# Altium schematic symbol library Schlib.SchLib: 725 symbols (part 2 of 6) (continued)
## CSS2H-2512R-1L00FE (continued)
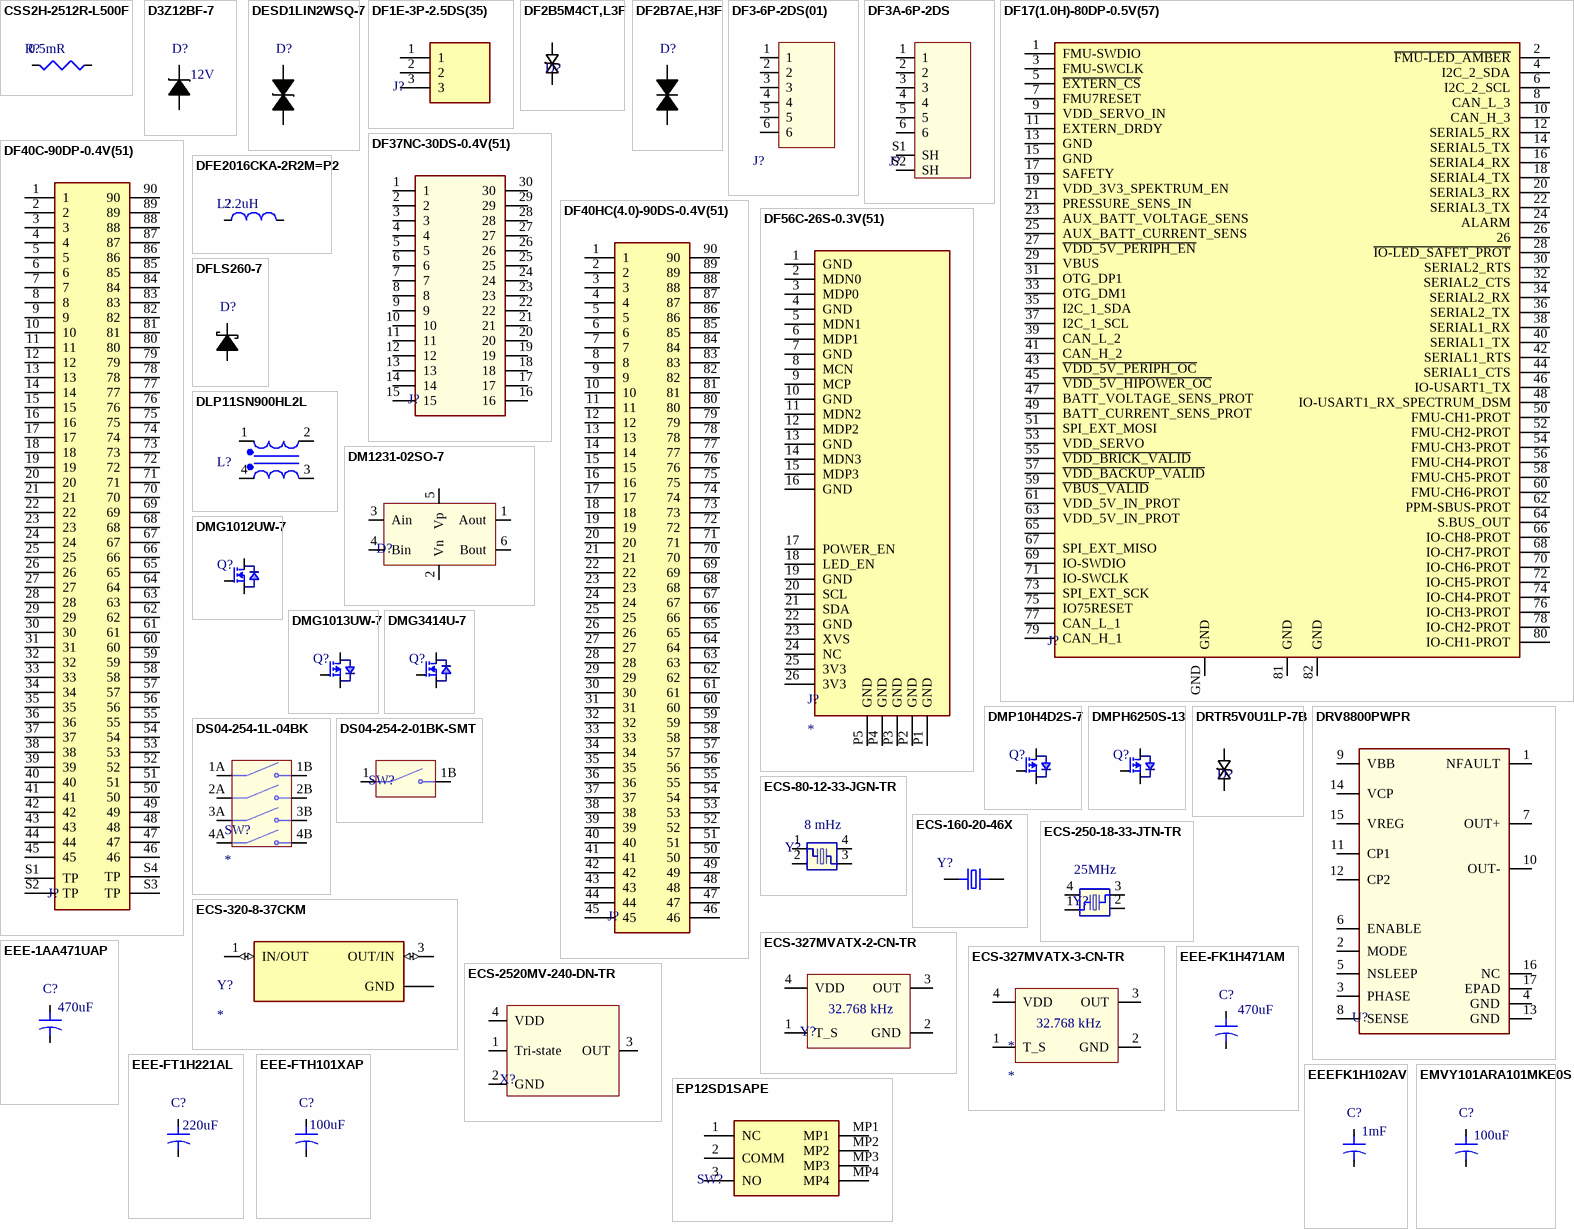
[diagram p7: symbols CSS2H-2512R-L500F to EP12SD1SAPE]

## CSS2H-2512R-L500F
designator R?  value 0.5mR  (hidden comment: *)
Res Current Sense Metal Strip 2512 0.00005 Ohm 1% 6W ±100ppm/°C T/R; Manufacturer: Bourns; Manufacturer Part Number: CSS2H-2512R-L500F; Temperature Coefficient: 50ppm/°C; Supplier: Avnet; Supplier Part Number: 34AK1558; RoHS: Yes; Category: Chip SMD Resistors; Stock: 5588; Pricing: 1=1.43, 25=1.16, 50=1.06, 100=0.918, 250=0.775 (USD); Case/Package: 2512; Case Code (Metric): 6432; Case Code (Imperial): 2512; Min Operating Temperature: -55°C; Max Operating Temperature: 170°C; Packaging: Cut Tape; Number of Terminations: 2; Tolerance: 1%; Max Power Dissipation: 6W; Features: Moisture Resistant; Series: CSS2H-2512; Power Rating: 6W; Resistor Type: Metal Strip; Resistance Tolerance: 1%; Length: 0.25inch; Width: 0.12inch; Height: 0.037inch; RoHS Compliant: Yes; Reach SVHC Compliant: No; ComponentLink1URL: http://www.farnell.com/datasheets/2058210.pdf?src-supplier=Farnell; ComponentLink1Description: http://www.farnell.com/datasheets/2058210.pdf?src-supplier=Farnell; ComponentLink2URL: https://datasheet.octopart.com/CSS2H-2512R-L500F-Bourns-datasheet-62345526.pdf?src-supplier=Newark; ComponentLink2Description: https://datasheet.octopart.com/CSS2H-2512R-L500F-Bourns-datasheet-62345526.pdf?src-supplier=Newark; ComponentLink3URL: http://www.farnell.com/datasheets/2058210.pdf?src-supplier=Element14; ComponentLink3Description: http://www.farnell.com/datasheets/2058210.pdf?src-supplier=Element14; ComponentLink4URL: http://www.farnell.com/datasheets/2058210.pdf?src-supplier=Newark; ComponentLink4Description: http://www.farnell.com/datasheets/2058210.pdf?src-supplier=Newark; ComponentLink5URL: https://www.bourns.com/docs/Product-Datasheets/css2h-2512.pdf?src-supplier=Digi-Key; ComponentLink5Description: https://www.bourns.com/docs/Product-Datasheets/css2h-2512.pdf?src-supplier=Digi-Key; ComponentLink6URL: https://datasheet.octopart.com/CSS2H-2512R-L500F-Bourns-datasheet-137010645.pdf?src-supplier=Electro+Sonic; ComponentLink6Description: https://datasheet.octopart.com/CSS2H-2512R-L500F-Bourns-datasheet-137010645.pdf?src-supplier=Electro+Sonic
footprint R 2512 6W Current sens
pins: 1 B, 2 A

## D3Z12BF-7
designator D?  Voltage - Zener: 12V  (hidden comment: *)
Zener Diode Single 11.99V 2.09% 10Ohm 400mW 2-Pin SOD-323F T/R; Manufacturer: Diodes; Manufacturer Part Number: D3Z12BF-7; Tolerance: 2%; Impedance: 10R; Max Reverse Leakage Current: 100nA; Forward Voltage: 900mV; ESD Protection: No; Test Current: 5mA; Supplier: Future Electronics; Supplier Part Number: 4153081; RoHS: Yes; Category: Zener Diodes; Stock: 27000; Pricing: 3000=0.0252, 9000=0.0243, 15000=0.0239, 60000=0.0228, 90000=0.0221 (USD); Mounting Technology: Surface Mount; Pins: 2; Contact Plating: Tin,Matte; Min Operating Temperature: -65°C; Max Operating Temperature: 150°C; Packaging: Tape and Reel; Package Quantity: 3000; Max Power Dissipation: 400mW; Zener Voltage: 12V; Voltage Tolerance: 2.09%; Termination: SMD/SMT; Zener Current: 100nA; Max Reverse Current: 100nA; Power Rating: 400mW; Series: -; Diode Type: ZENER; Length: 2.5mm; Width: 1.25mm; Height: 0.75mm; Reach SVHC Compliant: Yes; Lead Free: Lead Free; RoHS Compliant: Yes; ComponentLink1URL: http://components.arrow.com/part/dataview/51721222S9314677N2867?src-supplier=Arrow+Electronics; ComponentLink1Description: http://components.arrow.com/part/dataview/51721222S9314677N2867?src-supplier=Arrow+Electronics; ComponentLink2URL: http://www.mouser.com/ds/2/115/D3ZxVxBF-259596.pdf?src-supplier=Mouser; ComponentLink2Description: http://www.mouser.com/ds/2/115/D3ZxVxBF-259596.pdf?src-supplier=Mouser; ComponentLink3URL: https://www.diodes.com/assets/Datasheets/D3ZxVxBF.pdf?src-supplier=Digikey; ComponentLink3Description: https://www.diodes.com/assets/Datasheets/D3ZxVxBF.pdf?src-supplier=Digikey; ComponentLink4URL: http://www.diodes.com/datasheets/D3ZxVxBF.pdf?src-supplier=Avnet; ComponentLink4Description: http://www.diodes.com/datasheets/D3ZxVxBF.pdf?src-supplier=Avnet; ComponentLink5URL: https://datasheet.octopart.com/D3Z12BF-7-Diodes-Inc.-datasheet-101745804.pdf?src-supplier=Newark; ComponentLink5Description: https://datasheet.octopart.com/D3Z12BF-7-Diodes-Inc.-datasheet-101745804.pdf?src-supplier=Newark
footprint SC-90, SOD-323F
pins: 1 C, 2 A

## DESD1LIN2WSQ-7
designator D?  (value not drawn)
DESD1LIN2WSQ Series 24 V 3 A 160 mW SMT Bi-Directional TVS Diode - SOD-323; Manufacturer: Diodes; Manufacturer Part Number: DESD1LIN2WSQ-7; Number of Bidirectional Channels: 1; Reverse Standoff Voltage: 24V; Min Breakdown Voltage: 25.4V; Clamping Voltage: 50V; Peak Pulse Power: 160W; Power Line Protection: No; Peak Pulse Current: 3A; Supplier: Digi-Key; Supplier Part Number: DESD1LIN2WSQ-7DICT-ND; RoHS: Yes; Category: TVS Diodes; Stock: 23012; Pricing: 1=0.46000, 10=0.34600, 100=0.21530, 500=0.14728, 1000=0.11330 (USD); Mounting Technology: Surface Mount; Min Operating Temperature: -65°C; Max Operating Temperature: 150°C; Packaging: Tape and Reel; Resistor Type: Zener; RoHS Compliant: Yes; ComponentLink1URL: http://www.mouser.com/ds/2/115/DESD1LIN2WSQ-520303.pdf?src-supplier=Mouser; ComponentLink1Description: http://www.mouser.com/ds/2/115/DESD1LIN2WSQ-520303.pdf?src-supplier=Mouser; ComponentLink2URL: https://www.diodes.com/assets/Datasheets/DESD1LIN2WSQ.pdf?src-supplier=Digi-Key; ComponentLink2Description: https://www.diodes.com/assets/Datasheets/DESD1LIN2WSQ.pdf?src-supplier=Digi-Key
footprint SC-76, SOD-323
pins: 1, 2

## DF1E-3P-2.5DS(35)
designator J?  (value not drawn)
[SignalBee™]2.5mm Pitch Connector for Full Lock, Discrete Wire Connection, -35 ℃ to 85 ℃, RoHS; Manufacturer: HIROSE ELECTRIC; Manufacturer Part Number: DF1E-3P-2.5DS(35); Connector Type: Plug; Contact Pitch: 2.5mm; Contact Resistance: 30mΩ; Contact Voltage Rating (AC): 250V; Current Rating: 3A; Dielectric Material: Polyamide; Insulation Resistance: 1GΩ; Number of Positions: 3; Supplier: DigiKey; Supplier Part Number: H125157-ND; RoHS: Compliant; Category: Card Edge Connectors; Stock: 1876; Pricing: 1=0.56, 10=0.475, 100=0.4032, 500=0.35986, 1000=0.34267, 5000=0.30588, 10000=0.29129 (USD); Contact Gender: Male; Contact Material: Brass; Contact Mating Length: 4.4958mm; Contact Plating: Tin; Fastening Type: Latch; Height: 8mm; Length: 10mm; Lifecycle Status: Production; Max Operating Temperature: 85°C; Min Operating Temperature: -35°C; Mounting Technology: Through Hole; Pins: 3; Number of Rows: 1; Orientation: Right Angle; Pitch: 2.5mm; REACH SVHC: Yes; Terminal Pitch: 2.4892mm; Termination: Solder; Width: 13.8mm; ComponentLink1URL: https://datasheet.octopart.com:443/DF1E-3P-2.5DS%2835%29-HIROSE-ELECTRIC-datasheet-180000536.pdf?src-supplier=IHS; ComponentLink1Description: https://datasheet.octopart.com:443/DF1E-3P-2.5DS%2835%29-HIROSE-ELECTRIC-datasheet-180000536.pdf?src-supplier=IHS; ComponentLink2URL: https://datasheet.octopart.com:443/DF1E-3P-2.5DS%2835%29-HIROSE-ELECTRIC-datasheet-181927310.pdf?src-supplier=Electro+Sonic; ComponentLink2Description: https://datasheet.octopart.com:443/DF1E-3P-2.5DS%2835%29-HIROSE-ELECTRIC-datasheet-181927310.pdf?src-supplier=Electro+Sonic; ComponentLink3URL: https://datasheet.octopart.com:443/DF1E-3P-2.5DS%2835%29-HIROSE-ELECTRIC-datasheet-188748073.pdf?src-supplier=Master+Electronics; ComponentLink3Description: https://datasheet.octopart.com:443/DF1E-3P-2.5DS%2835%29-HIROSE-ELECTRIC-datasheet-188748073.pdf?src-supplier=Master+Electronics; ComponentLink4URL: https://datasheet.octopart.com:443/DF1E-3P-2.5DS%2835%29-Hirose-datasheet-168215267.pdf?src-supplier=TME; ComponentLink4Description: https://datasheet.octopart.com:443/DF1E-3P-2.5DS%2835%29-Hirose-datasheet-168215267.pdf?src-supplier=TME; ComponentLink5URL: https://datasheet.octopart.com:443/DF1E-3P-2.5DS%2835%29-Hirose-datasheet-163673710.pdf?src-supplier=Future+Electronics; ComponentLink5Description: https://datasheet.octopart.com:443/DF1E-3P-2.5DS%2835%29-Hirose-datasheet-163673710.pdf?src-supplier=Future+Electronics; ComponentLink6URL: https://datasheet.octopart.com:443/DF1E-3P-2.5DS%2835%29-Hirose-datasheet-154565669.pdf?src-supplier=Sager+Electronics; ComponentLink6Description: https://datasheet.octopart.com:443/DF1E-3P-2.5DS%2835%29-Hirose-datasheet-154565669.pdf?src-supplier=Sager+Electronics; ComponentLink7URL: https://datasheet.octopart.com:443/DF1E-3P-2.5DS%2835%29-Hirose-datasheet-140476234.pdf?src-supplier=Sager+Electronics; ComponentLink7Description: https://datasheet.octopart.com:443/DF1E-3P-2.5DS%2835%29-Hirose-datasheet-140476234.pdf?src-supplier=Sager+Electronics; ComponentLink8URL: https://datasheet.octopart.com:443/DF1E-3P-2.5DS%2835%29-Hirose-datasheet-62290548.pdf?src-supplier=Sager+Electronics; ComponentLink8Description: https://datasheet.octopart.com:443/DF1E-3P-2.5DS%2835%29-Hirose-datasheet-62290548.pdf?src-supplier=Sager+Electronics; ComponentLink9URL: https://sigma.octopart.com:443/145363035/technical_drawing/Hirose-DF1E-3P-2.5DS%2835%29.pdf?src-supplier=Hirose+SCT; ComponentLink9Description: https://sigma.octopart.com:443/145363035/technical_drawing/Hirose-DF1E-3P-2.5DS%2835%29.pdf?src-supplier=Hirose+SCT; ComponentLink10URL: https://datasheet.octopart.com:443/DF1E-3P-2.5DS%2835%29-Hirose-datasheet-145363033.pdf?src-supplier=Hirose+SCT; ComponentLink10Description: https://datasheet.octopart.com:443/DF1E-3P-2.5DS%2835%29-Hirose-datasheet-145363033.pdf?src-supplier=Hirose+SCT
footprint DF1E-3P-2.5DS(35)
pins: 1, 2, 3

## DF2B5M4CT,L3F
designator D?  (value not drawn)
ESD Suppressors / TVS Diodes ESD protection diode .3pF 5.0V; Manufacturer: Toshiba; Manufacturer Part Number: DF2B5M4CT,L3F; Supplier: Digikey; Supplier Part Number: DF2B5M4CTL3FCT-ND; RoHS: No; Category: TVS Diodes; Stock: 816; Pricing: 1=0.17, 10=0.113, 100=0.0758, 500=0.0578, 1000=0.05172, 2000=0.0465, 5000=0.04072 (USD); ComponentLink1URL: https://toshiba.semicon-storage.com/info/docget.jsp?did=55770&prodName=DF2B5M4CT&src-supplier=Digikey; ComponentLink1Description: https://toshiba.semicon-storage.com/info/docget.jsp?did=55770&prodName=DF2B5M4CT&src-supplier=Digikey
footprint DF2B5M4CT,L3F
pins: 1, 2

## DF2B7AE,H3F
designator D?  (value not drawn)
ESD Suppressor Diode TVS Bi-Dir 5.5V 2-Pin ESC T/R; Manufacturer: Toshiba; Manufacturer Part Number: DF2B7AE,H3F; Supplier: Mouser; Supplier Part Number: 757-DF2B7AEH3F; RoHS: No; Category: TVS Diodes; Stock: 111094; Pricing: 1=0.21, 10=0.146, 50=0.146, 100=0.059, 1000=0.036, 10000=0.027 (USD)
footprint SC-79, SOD-523
pins: 1, 2

## DF3-6P-2DS(01)
designator J?  (value not drawn)
Board-to-Cable Connector (Terminal 1 Row Type) with 2-mm Pitch - DF3 Series (HIROSE ELECTRIC); Manufacturer Part Number: DF3-6P-2DS(01); Supplier: Rs; Supplier Part Number: 7794954P; Manufacturer: Hirose; RoHS: Yes; Category: Headers and Wire Housings; Stock: 65; Pricing: 25=6.502, 50=6.362 (HKD); ComponentLink1URL: https://datasheet.ciiva.com/30492/0900766b8122dd93-30492925.pdf?src-supplier=Rs; ComponentLink1Description: https://datasheet.ciiva.com/30492/0900766b8122dd93-30492925.pdf?src-supplier=Rs; ComponentLink2URL: https://datasheet.ciiva.com/26938/getdatasheetpartid-434437-26938796.pdf?src-supplier=Verical; ComponentLink2Description: https://datasheet.ciiva.com/26938/getdatasheetpartid-434437-26938796.pdf?src-supplier=Verical; ComponentLink3URL: https://datasheet.ciiva.com/5151/e54300012-5151166.pdf?src-supplier=Mouser; ComponentLink3Description: https://datasheet.ciiva.com/5151/e54300012-5151166.pdf?src-supplier=Mouser; ComponentLink4URL: https://datasheet.ciiva.com/711/e54300012-711200.pdf?src-supplier=Digikey; ComponentLink4Description: https://datasheet.ciiva.com/711/e54300012-711200.pdf?src-supplier=Digikey; ComponentLink5URL: https://datasheet.ciiva.com/9481/e54300012-9481366.pdf?src-supplier=Avnet; ComponentLink5Description: https://datasheet.ciiva.com/9481/e54300012-9481366.pdf?src-supplier=Avnet
footprint DF3-6P-2DS(01) (Footprint not found)
pins: 1, 2, 3, 4, 5, 6

## DF3A-6P-2DS
designator J?  (value not drawn)
Board-to-Cable Connector (Terminal 1 Row Type) with 2-mm Pitch - DF3 Series (HIROSE ELECTRIC); Manufacturer Part Number: DF3A-6P-2DS; Current Rating: 3A; Voltage Rating: 250V; Number of Positions: 6; Gender: Male; Insulation Resistance: 1GR; Connector Type: Header; Pitch: 2mm; Supplier: Newark; Supplier Part Number: 24R6036; Manufacturer: Hirose; RoHS: Yes; Category: Headers and Wire Housings; Mounting Technology: Through Hole; Contact Plating: Tin; Contact Material: Brass,Copper Alloy; Insulation Material: Nylon; Housing Color: Black; Housing Material: Polyamide; Contact Shape: Square; Contact Finish - Mating: TIN; Insulation Color: Black; Min Operating Temperature: -55°C; Max Operating Temperature: 105°C; Package Quantity: 100; Packaging: Bulk; Number of Rows: 1; Contact Gender: Male; Termination: Through Hole; Series: DF3; Contact Type: Male Pin; Number of Contacts: 6; Orientation: Right Angle; Fastening Type: Pull; Length: 14mm; Height: 5mm; RoHS Compliant: Yes; Reach SVHC Compliant: No; Lead Free: Lead Free; Flammability Rating: UL94 V-0; ComponentLink1URL: https://datasheet.ciiva.com/11752/0900766b808069aa-11752280.pdf?src-supplier=Rs; ComponentLink1Description: https://datasheet.ciiva.com/11752/0900766b808069aa-11752280.pdf?src-supplier=Rs; ComponentLink2URL: https://datasheet.ciiva.com/711/e54300012-711081.pdf?src-supplier=Digikey; ComponentLink2Description: https://datasheet.ciiva.com/711/e54300012-711081.pdf?src-supplier=Digikey; ComponentLink3URL: https://datasheet.ciiva.com/16211/e54300012-16211577.pdf?src-supplier=Future+Electronics; ComponentLink3Description: https://datasheet.ciiva.com/16211/e54300012-16211577.pdf?src-supplier=Future+Electronics
footprint DF3A-6P-2DS
pins: 1, 2, 3, 4, 5, 6, S1 SH, S2 SH

## DF17(1.0H)-80DP-0.5V(57)
designator J?  (value not drawn)
Board-to-Board Connector with 0.5-mm Pitch, 4 to 8-mm Height - DF17 Series; Manufacturer: Hirose; Manufacturer Part Number: DF17(1.0H)-80DP-0.5V(57); Number of Positions: 80; Gender: Male; Mated Stacking Heights: 4mm; Row Spacing: 5.7mm; Supplier: Mouser; Supplier Part Number: 798-DF1710H80DP05V57; RoHS: Yes; Category: Headers and Wire Housings; Stock: 19920; Pricing: 1=2.86, 10=2.37, 50=2.37, 100=2.22, 1000=1.6, 10000=1.6 (USD); Mounting Technology: Surface Mount; Contact Plating: Gold; Contact Material: Bronze; Number of Rows: 2; Packaging: Tape and Reel; Package Quantity: 1000; Series: DF17; Number of Contacts: 80; Termination: SMD/SMT; Lead Free: Lead Free; RoHS Compliant: Yes; Reach SVHC Compliant: No; ComponentLink1URL: https://datasheet.ciiva.com/8038/1726048-8038857.pdf?src-supplier=Element14; ComponentLink1Description: https://datasheet.ciiva.com/8038/1726048-8038857.pdf?src-supplier=Element14
footprint DF17(1.0H)-80DP-0.5V(57)
pins: 1 FMU-SWDIO, 2 ~{FMU-LED_AMBER}, 3 FMU-SWCLK, 4 I2C_2_SDA, 5 ~{EXTERN_CS}, 6 I2C_2_SCL, 7 FMU7RESET, 8 CAN_L_3, 9 VDD_SERVO_IN, 10 CAN_H_3, 11 EXTERN_DRDY, 12 SERIAL5_RX, 13 GND, 14 SERIAL5_TX, 15 GND, 16 SERIAL4_RX, 17 SAFETY, 18 SERIAL4_TX, 19 VDD_3V3_SPEKTRUM_EN, 20 SERIAL3_RX, 21 PRESSURE_SENS_IN, 22 SERIAL3_TX, 23 AUX_BATT_VOLTAGE_SENS, 24 ALARM, 25 AUX_BATT_CURRENT_SENS, 26, 27 ~{VDD_5V_PERIPH_EN}, 28 ~{IO-LED_SAFET_PROT}, 29 VBUS, 30 SERIAL2_RTS, 31 OTG_DP1, 32 SERIAL2_CTS, 33 OTG_DM1, 34 SERIAL2_RX, 35 I2C_1_SDA, 36 SERIAL2_TX, 37 I2C_1_SCL, 38 SERIAL1_RX, 39 CAN_L_2, 40 SERIAL1_TX, 41 CAN_H_2, 42 SERIAL1_RTS, 43 ~{VDD_5V_PERIPH_OC}, 44 SERIAL1_CTS, 45 ~{VDD_5V_HIPOWER_OC}, 46 IO-USART1_TX, 47 BATT_VOLTAGE_SENS_PROT, 48 IO-USART1_RX_SPECTRUM_DSM, 49 BATT_CURRENT_SENS_PROT, 50 FMU-CH1-PROT, 51 SPI_EXT_MOSI, 52 FMU-CH2-PROT, 53 VDD_SERVO, 54 FMU-CH3-PROT, 55 ~{VDD_BRICK_VALID}, 56 FMU-CH4-PROT, 57 ~{VDD_BACKUP_VALID}, 58 FMU-CH5-PROT, 59 ~{VBUS_VALID}, 60 FMU-CH6-PROT, 61 VDD_5V_IN_PROT, 62 PPM-SBUS-PROT, 63 VDD_5V_IN_PROT, 64 S.BUS_OUT, 65, 66 IO-CH8-PROT, 67 SPI_EXT_MISO, 68 IO-CH7-PROT, 69 IO-SWDIO, 70 IO-CH6-PROT, 71 IO-SWCLK, 72 IO-CH5-PROT, 73 SPI_EXT_SCK, 74 IO-CH4-PROT, 75 IO75RESET, 76 IO-CH3-PROT, 77 CAN_L_1, 78 IO-CH2-PROT, 79 CAN_H_1, 80 IO-CH1-PROT, 81 GND, 82 GND, GND

## DF37NC-30DS-0.4V(51)
designator J?  (value not drawn)
Conn Stacking RCP 30 POS 0.98mm Stack Height 0.4mm Solder ST SMD Emboss T/R; Manufacturer: Hirose; Manufacturer Part Number: DF37NC-30DS-0.4V(51); Supplier: Digi-Key; Supplier Part Number: H11856CT-ND; RoHS: Yes; Category: Connectors; ComponentLink1URL: http://www.mouser.com/ds/2/185/DF37_catalog-939311.pdf?src-supplier=Mouser; ComponentLink1Description: http://www.mouser.com/ds/2/185/DF37_catalog-939311.pdf?src-supplier=Mouser; ComponentLink2URL: https://www.hirose.com/product/document?clcode=CL0684-3008-1-53&amp;productname=DF37B-20DP-0.4V(53)&amp;series=DF37&amp;documenttype=Catalog&amp;lang=en&amp;documentid=D49052_en&src-supplier=Digi-Key; ComponentLink2Description: https://www.hirose.com/product/document?clcode=CL0684-3008-1-53&amp;productname=DF37B-20DP-0.4V(53)&amp;series=DF37&amp;documenttype=Catalog&amp;lang=en&amp;documentid=D49052_en&src-supplier=Digi-Key; ComponentLink3URL: https://www.hirose.com/product/en/download_file/key_name/DF37NC-30DS-0.4V%2851%29/category/Specification%20Sheet/doc_file_id/46745/?file_category_id=9&item_id=06843313551&is_series=&src-supplier=Digi-Key; ComponentLink3Description: https://www.hirose.com/product/en/download_file/key_name/DF37NC-30DS-0.4V%2851%29/category/Specification%20Sheet/doc_file_id/46745/?file_category_id=9&item_id=06843313551&is_series=&src-supplier=Digi-Key
footprint DF37NC-30DS-0.4V(51)
pins: 1, 2, 3, 4, 5, 6, 7, 8, 9, 10, 11, 12, 13, 14, 15, 16, 17, 18, 19, 20, 21, 22, 23, 24, 25, 26, 27, 28, 29, 30

## DF40C-90DP-0.4V(51)
designator J?  (value not drawn)
Board-to-Board Connector with 0.4-mm Pitch, 1.5 - 4.0-mm Height - DF40 Series (HIROSE ELECTRIC); Manufacturer Part Number: DF40C-90DP-0.4V(51); Current Rating: 300mA; Voltage Rating: 30V; Number of Positions: 90; Connector Type: Plug; Pitch: 0.4mm; Mated Stacking Heights: 4mm; Supplier: Digikey; Supplier Part Number: H11878CT-ND; Manufacturer: Hirose; RoHS: Yes; Category: Board to Board Connectors; Stock: 25231; Pricing: 1=1.87, 10=1.525, 25=1.4056, 50=1.3216, 100=1.2428, 250=1.14576, 500=1.07746, 1000=1.01326, 2500=0.9375 (USD); Mounting Technology: Surface Mount; Contact Material: Bronze; Contact Plating: Gold; Housing Material: Polymer; Package Quantity: 5000; Number of Rows: 2; Packaging: Tape and Reel; Termination: SMD/SMT; Series: DF40; Lead Free: Lead Free; RoHS Compliant: Yes; ComponentLink1URL: http://www.mouser.com/ds/2/185/DF40_catalog-939157.pdf?src-supplier=Mouser; ComponentLink1Description: http://www.mouser.com/ds/2/185/DF40_catalog-939157.pdf?src-supplier=Mouser; ComponentLink2URL: https://www.hirose.com/product/document?clcode=CL0684-4003-3-51&amp;productname=DF40C-60DP-0.4V(51)&amp;series=DF40&amp;documenttype=Catalog&amp;lang=en&amp;documentid=D31649_en&src-supplier=Digikey; ComponentLink2Description: https://www.hirose.com/product/document?clcode=CL0684-4003-3-51&amp;productname=DF40C-60DP-0.4V(51)&amp;series=DF40&amp;documenttype=Catalog&amp;lang=en&amp;documentid=D31649_en&src-supplier=Digikey; ComponentLink3URL: https://www.hirose.com/product/en/download_file/key_name/DF40C-90DP-0.4V%2851%29/category/Specification%20Sheet/doc_file_id/46853/?file_category_id=9&item_id=06844125051&is_series=&src-supplier=Digikey; ComponentLink3Description: https://www.hirose.com/product/en/download_file/key_name/DF40C-90DP-0.4V%2851%29/category/Specification%20Sheet/doc_file_id/46853/?file_category_id=9&item_id=06844125051&is_series=&src-supplier=Digikey; ComponentLink4URL: https://datasheet.octopart.com/DF40C-90DP-0.4V%2851%29-Hirose-datasheet-130255728.pdf?src-supplier=Future+Electronics; ComponentLink4Description: https://datasheet.octopart.com/DF40C-90DP-0.4V%2851%29-Hirose-datasheet-130255728.pdf?src-supplier=Future+Electronics; ComponentLink5URL: https://datasheet.octopart.com/DF40C-90DP-0.4V%2851%29-Hirose-datasheet-138123797.pdf?src-supplier=LKR; ComponentLink5Description: https://datasheet.octopart.com/DF40C-90DP-0.4V%2851%29-Hirose-datasheet-138123797.pdf?src-supplier=LKR
footprint DF40C-90DP-0.4V(51)
pins: 1, 2, 3, 4, 5, 6, 7, 8, 9, 10, 11, 12, 13, 14, 15, 16, 17, 18, 19, 20, 21, 22, 23, 24, 25, 26, 27, 28, 29, 30, 31, 32, 33, 34, 35, 36, 37, 38, 39, 40, 41, 42, 43, 44, 45, 46, 47, 48, 49, 50, 51, 52, 53, 54, 55, 56, 57, 58, 59, 60, 61, 62, 63, 64, 65, 66, 67, 68, 69, 70, 71, 72, 73, 74, 75, 76, 77, 78, 79, 80, 81, 82, 83, 84, 85, 86, 87, 88, 89, 90, S1 TP, S2 TP, S3 TP, S4 TP

## DF40HC(4.0)-90DS-0.4V(51)
designator J?  (value not drawn)
90 Position Connector Receptacle, Center Strip Contacts Surface Mount Gold; Manufacturer: Hirose; Manufacturer Part Number: DF40HC(4.0)-90DS-0.4V(51); Voltage Rating: 30V; Current Rating: 300mA; Number of Positions: 90; Pitch: 0.4mm; Stack Height: 4mm; Supplier: Digikey; Supplier Part Number: H11998CT-ND; RoHS: Yes; Category: Board to Board Connectors; Stock: 6447; Pricing: 1=2.55, 10=2.074, 25=1.9116, 50=1.7976, 100=1.6904, 250=1.55848, 500=1.46562, 1000=1.37831 (USD); Mounting Technology: Surface Mount; Contact Plating: Gold; Contact Material: Bronze; Housing Material: Polymer; Package Quantity: 2000; Number of Rows: 2; Packaging: Tape and Reel; Connector Type: Receptacle; Termination: SMD/SMT; Gender: Receptacle; Number of Contacts: 90; Series: DF40; Mated Stacking Heights: 4mm; Reach SVHC Compliant: No; RoHS Compliant: Yes; ComponentLink1URL: https://datasheet.ciiva.com/46408/1824826-46408922.pdf?src-supplier=Element14; ComponentLink1Description: https://datasheet.ciiva.com/46408/1824826-46408922.pdf?src-supplier=Element14
footprint DF40HC4090DS04V51
pins: 1, 2, 3, 4, 5, 6, 7, 8, 9, 10, 11, 12, 13, 14, 15, 16, 17, 18, 19, 20, 21, 22, 23, 24, 25, 26, 27, 28, 29, 30, 31, 32, 33, 34, 35, 36, 37, 38, 39, 40, 41, 42, 43, 44, 45, 46, 47, 48, 49, 50, 51, 52, 53, 54, 55, 56, 57, 58, 59, 60, 61, 62, 63, 64, 65, 66, 67, 68, 69, 70, 71, 72, 73, 74, 75, 76, 77, 78, 79, 80, 81, 82, 83, 84, 85, 86, 87, 88, 89, 90

## DF56C-26S-0.3V(51)
designator J?
0.3mm Pitch, Vertical Mating, Board-to-Fine Coaxial Cable, -35 ℃ to 85 ℃, RoHS; Manufacturer: Hirose; Manufacturer Part Number: DF56C-26S-0.3V(51); Connector Type: Receptacle; Number of Positions: 26; Voltage Rating (AC): 30V; Supplier: SHENGYU ELECTRONICS; Supplier Part Number: DF56C-26S-0.3V(51); RoHS: Yes; Category: Headers and Wire Housings; Stock: 4188; Pricing: 1=1.6614, 10=1.6282, 100=1.5783, 1000=1.5285, 10000=1.462 (USD); Mounting Technology: Surface Mount; Contact Material: Bronze; Contact Finish - Mating: GOLD; Insulation Color: Black; Insulation Material: Polymer; Min Operating Temperature: -35°C; Max Operating Temperature: 85°C; Package Quantity: 5000; Number of Rows: 1; Fastening Type: Friction; Packaging: Tape and Reel; Termination: Solder; Series: DF56; Contact Type: Non-Gendered; RoHS Compliant: Yes; Flammability Rating: UL94 V-0; ComponentLink1URL: http://www.mouser.com/ds/2/185/DF56_catalog-939255.pdf?src-supplier=Mouser; ComponentLink1Description: http://www.mouser.com/ds/2/185/DF56_catalog-939255.pdf?src-supplier=Mouser; ComponentLink2URL: https://www.hirose.com/product/document?clcode=CL0662-5607-0-51&amp;productname=DF56-50P-0.3SD(51)&amp;series=DF56&amp;documenttype=Catalog&amp;lang=en&amp;documentid=D49344_en&src-supplier=Digikey; ComponentLink2Description: https://www.hirose.com/product/document?clcode=CL0662-5607-0-51&amp;productname=DF56-50P-0.3SD(51)&amp;series=DF56&amp;documenttype=Catalog&amp;lang=en&amp;documentid=D49344_en&src-supplier=Digikey; ComponentLink3URL: https://datasheet.octopart.com/DF56C-26S-0.3V%2851%29-Hirose-datasheet-140603365.pdf?src-supplier=Sager+Electronics; ComponentLink3Description: https://datasheet.octopart.com/DF56C-26S-0.3V%2851%29-Hirose-datasheet-140603365.pdf?src-supplier=Sager+Electronics
footprint DF56C-26S-0.3V(51)
pins: 1 GND, 2 MDN0, 3 MDP0, 4 GND, 5 MDN1, 6 MDP1, 7 GND, 8 MCN, 9 MCP, 10 GND, 11 MDN2, 12 MDP2, 13 GND, 14 MDN3, 15 MDP3, 16 GND, 17 POWER_EN, 18 LED_EN, 19 GND, 20 SCL, 21 SDA, 22 GND, 23 XVS, 24 NC, 25 3V3, 26 3V3, P1 GND (power), P2 GND (power), P3 GND (power), P4 GND (power), P5 GND (power)

## DFE2016CKA-2R2M=P2
designator L?  value 2.2uH  (hidden comment: *)
125 General WoundMetal; Manufacturer: Murata; Manufacturer Part Number: DFE2016CKA-2R2M=P2; Supplier: Mouser; Supplier Part Number: 81-DFE2016CKA2R2M=P2; RoHS: No; Category: Fixed Inductors; Stock: 5406; Pricing: 1=0.42, 10=0.378, 50=0.378, 100=0.26, 1000=0.17, 10000=0.139 (USD); Case/Package: 0805
footprint DFE2016CKA-2R2M=P2
pins: 1 B, 2 A

## DFLS260-7
designator D?  (value not drawn)
VR=60V IF=2A; Manufacturer: Diodes; Manufacturer Part Number: DFLS260-7; Supplier: Rs; Supplier Part Number: 8222453P; RoHS: Yes; Category: Rectifier Diodes; Stock: 5175; Pricing: 150=0.24, 750=0.229, 1500=0.178 (EUR); ComponentLink1URL: https://datasheet.ciiva.com/8301/ds31476-8301781.pdf?src-supplier=Avnet; ComponentLink1Description: https://datasheet.ciiva.com/8301/ds31476-8301781.pdf?src-supplier=Avnet; ComponentLink2URL: https://datasheet.ciiva.com/13083/ds31476-56424-13083699.pdf?src-supplier=Mouser; ComponentLink2Description: https://datasheet.ciiva.com/13083/ds31476-56424-13083699.pdf?src-supplier=Mouser; ComponentLink3URL: https://datasheet.ciiva.com/18567/ds31476-18567419.pdf?src-supplier=Digikey; ComponentLink3Description: https://datasheet.ciiva.com/18567/ds31476-18567419.pdf?src-supplier=Digikey
footprint PowerDI-123
pins: 1 C, 2 A

## DLP11SN900HL2L
designator L?  (value not drawn)
CMC 90 OHM 150MA 2 LN SMD; Manufacturer: Murata; Manufacturer Part Number: DLP11SN900HL2L; Impedance: 90R; Number of Lines: 2; Shielding: Shielded; Tolerance: 20%; Voltage Rating: 5V; DC Resistance (DCR): 1.5R; Test Frequency: 100MHz; Supplier: Digi-Key; Supplier Part Number: 490-5143-1-ND; RoHS: Yes; Category: Common Mode Chokes; Stock: 523479; Pricing: 1=0.420000, 10=0.366000, 25=0.339600, 50=0.287200, 100=0.261100, 250=0.245400, 500=0.219320, 1000=0.177540 (USD); Mounting Technology: Surface Mount; Case/Package: 0504; Case Code (Metric): 1210; Case Code (Imperial): 0504; Min Operating Temperature: -40°C; Max Operating Temperature: 85°C; Package Quantity: 1; Packaging: Tape and Reel; Max Current Rating: 150mA; Current Rating: 150mA; Current: 150mA; Max DC Current: 150mA; Termination: SMD/SMT; DC Current: 150mA; Series: DLP11S; Technology: THIN FILM; DC Resistance-Max: 1.5R; Voltage Rating (DC): 5V; Length: 1.25mm; Width: 0.039inch; Height: 0.82mm; Depth: 1mm; Radiation Hardening: No; Reach SVHC Compliant: Yes; Military Standard: Not; Lead Free: Lead Free; RoHS Compliant: Yes; ComponentLink1URL: https://datasheet.ciiva.com/18183/getdatasheetpartid-253367-18183352.pdf?src-supplier=Verical; ComponentLink1Description: https://datasheet.ciiva.com/18183/getdatasheetpartid-253367-18183352.pdf?src-supplier=Verical; ComponentLink2URL: https://datasheet.ciiva.com/11799/0900766b80f15486-11799566.pdf?src-supplier=Rs; ComponentLink2Description: https://datasheet.ciiva.com/11799/0900766b80f15486-11799566.pdf?src-supplier=Rs; ComponentLink3URL: https://datasheet.ciiva.com/46415/1668055-46415802.pdf?src-supplier=Element14; ComponentLink3Description: https://datasheet.ciiva.com/46415/1668055-46415802.pdf?src-supplier=Element14; ComponentLink4URL: https://datasheet.ciiva.com/1007/l0114e-1007588.pdf?src-supplier=Digi-Key; ComponentLink4Description: https://datasheet.ciiva.com/1007/l0114e-1007588.pdf?src-supplier=Digi-Key; ComponentLink5URL: https://datasheet.ciiva.com/1007/l0114e-1007587.pdf?src-supplier=Digi-Key; ComponentLink5Description: https://datasheet.ciiva.com/1007/l0114e-1007587.pdf?src-supplier=Digi-Key; ComponentLink6URL: https://datasheet.ciiva.com/1007/l0114e-1007589.pdf?src-supplier=Digi-Key; ComponentLink6Description: https://datasheet.ciiva.com/1007/l0114e-1007589.pdf?src-supplier=Digi-Key; ComponentLink7URL: https://datasheet.ciiva.com/8510/l0114e-8510926.pdf?src-supplier=Avnet; ComponentLink7Description: https://datasheet.ciiva.com/8510/l0114e-8510926.pdf?src-supplier=Avnet
footprint DLP11SN900HL2L
pins: 1, 2, 3, 4

## DM1231-02SO-7
designator D?  (value not drawn)
MOSFET P-CH 30V 21A/34A 8DFN; Manufacturer: Diodes; Manufacturer Part Number: DM1231-02SO-7; Number of Unidirectional Channels: 2; Reverse Standoff Voltage: 5V; Min Breakdown Voltage: 6V; Clamping Voltage: 14V; Peak Pulse Current: 7A; Power Line Protection: Yes; Continuous Drain Current (ID): 34A; Rds On Max: 7.8mR; Input Capacitance: 2.83nF; Max Power Dissipation: 30W; Supplier: Digi-Key; Supplier Part Number: DM1231-02SO-7DICT-ND; RoHS: Yes; Category: TVS Diodes; Stock: 14727; Pricing: 1=0.36000, 10=0.29000, 100=0.19780, 500=0.14832, 1000=0.11124 (USD); Mounting Technology: Surface Mount; Case/Package: SOT-23-6; Min Operating Temperature: -55°C; Max Operating Temperature: 150°C; Packaging: Tape and Reel; RoHS Compliant: Yes; ComponentLink1URL: https://www.diodes.com/assets/Datasheets/DM1231-02SO.pdf?src-supplier=Digi-Key; ComponentLink1Description: https://www.diodes.com/assets/Datasheets/DM1231-02SO.pdf?src-supplier=Digi-Key; Pins: 8; Drain to Source Voltage (Vdss): 30V; ComponentLink2URL: http://www.aosmd.com/res/data_sheets/AONR21357.pdf?src-supplier=Digi-Key; ComponentLink2Description: http://www.aosmd.com/res/data_sheets/AONR21357.pdf?src-supplier=Digi-Key
footprint SOT-23-6
pins: 1 Aout, 2 Vn, 3 Ain, 4 Bin, 5 Vp, 6 Bout

## DMG1012UW-7
designator Q?  (value not drawn)
MOSFET N-CH 20V 1A SOT323; Manufacturer: Diodes Zetex; Manufacturer Part Number: DMG1012UW-7; Rise Time: 7.4ns; Fall Time: 12.3ns; Turn-Off Delay Time: 26.7ns; Turn-On Delay Time: 5.1ns; Gate to Source Voltage (Vgs): 6V; Rds On Max: 450mR; Input Capacitance: 60.67pF; Max Power Dissipation: 290mW; Number of Elements: 1; Drain to Source Resistance: 300mR; Element Configuration: Single; Polarity: N-CHANNEL; Supplier: Future Electronics; Supplier Part Number: 7104900; Category: MOSFETs; Stock: 12000; Pricing: 1=0.23500, 15=0.17900, 75=0.14400, 300=0.11400, 1500=0.07940 (USD); Mounting Technology: Surface Mount; Case/Package: SOT-323; Pins: 3; Contact Plating: Tin,Matte; Weight: 0.000212oz; Min Operating Temperature: -55°C; Max Operating Temperature: 150°C; Packaging: Tape and Reel; Package Quantity: 3000; Continuous Drain Current (ID): 1A; Series: -; Drain to Source Voltage (Vdss): 20V; Drain to Source Breakdown Voltage: 20V; Power Dissipation: 290mW; Number of Channels: 1; Length: 2.2mm; Width: 1.35mm; Height: 1mm; Radiation Hardening: No; Reach SVHC Compliant: Yes; Lead Free: Lead Free; RoHS Compliant: Yes; ComponentLink1URL: https://datasheet.ciiva.com/4443/ds31859-90313-4443117.pdf?src-supplier=Mouser; ComponentLink1Description: https://datasheet.ciiva.com/4443/ds31859-90313-4443117.pdf?src-supplier=Mouser; ComponentLink2URL: https://datasheet.ciiva.com/11174/ds31859-11174966.pdf?src-supplier=Avnet; ComponentLink2Description: https://datasheet.ciiva.com/11174/ds31859-11174966.pdf?src-supplier=Avnet; ComponentLink3URL: https://datasheet.ciiva.com/6383/ds31859-6383798.pdf?src-supplier=Digi-Key; ComponentLink3Description: https://datasheet.ciiva.com/6383/ds31859-6383798.pdf?src-supplier=Digi-Key; ComponentLink4URL: https://datasheet.ciiva.com/6383/ds31859-6383800.pdf?src-supplier=Digi-Key; ComponentLink4Description: https://datasheet.ciiva.com/6383/ds31859-6383800.pdf?src-supplier=Digi-Key; RoHS: Yes
footprint SOT-323, SC-70
pins: 1 G, 2 S, 3 D

## DMG1013UW-7
designator Q?  (value not drawn)
DMG1013UW Series 20 V 750 mOhm P-Channel Enhancement Mode Mosfet - SOT-323; Manufacturer: Diodes; Manufacturer Part Number: DMG1013UW-7; Supplier: Digikey; Supplier Part Number: DMG1013UW-7DICT-ND; RoHS: Yes; Category: MOSFETs; Stock: 247498; Pricing: 1=0.34, 10=0.232, 100=0.1134, 500=0.0946, 1000=0.06572 (USD); ComponentLink1URL: https://datasheet.ciiva.com/16369/ds31861-16369875.pdf?src-supplier=Future+Electronics; ComponentLink1Description: https://datasheet.ciiva.com/16369/ds31861-16369875.pdf?src-supplier=Future+Electronics; ComponentLink2URL: https://datasheet.ciiva.com/4442/ds31861-67449-4442919.pdf?src-supplier=Mouser; ComponentLink2Description: https://datasheet.ciiva.com/4442/ds31861-67449-4442919.pdf?src-supplier=Mouser; ComponentLink3URL: https://datasheet.ciiva.com/934/ds31861-934532.pdf?src-supplier=Digikey; ComponentLink3Description: https://datasheet.ciiva.com/934/ds31861-934532.pdf?src-supplier=Digikey; ComponentLink4URL: https://datasheet.ciiva.com/934/ds31861-934533.pdf?src-supplier=Digikey; ComponentLink4Description: https://datasheet.ciiva.com/934/ds31861-934533.pdf?src-supplier=Digikey; ComponentLink5URL: https://datasheet.ciiva.com/934/ds31861-934534.pdf?src-supplier=Digikey; ComponentLink5Description: https://datasheet.ciiva.com/934/ds31861-934534.pdf?src-supplier=Digikey; ComponentLink6URL: https://datasheet.ciiva.com/11174/ds31861-11174967.pdf?src-supplier=Avnet; ComponentLink6Description: https://datasheet.ciiva.com/11174/ds31861-11174967.pdf?src-supplier=Avnet
footprint SOT-323, SC-70
pins: 1 G, 2 S, 3 D

## DMG3414U-7
designator Q?  (value not drawn)
Trans MOSFET N-CH 20V 4.2A Automotive 3-Pin SOT-23 T/R; Manufacturer: Diodes; Manufacturer Part Number: DMG3414U-7; Rise Time: 8.3ns; Fall Time: 9.6ns; Turn-Off Delay Time: 40.1ns; Turn-On Delay Time: 8.1ns; Gate to Source Voltage (Vgs): 8V; Input Capacitance: 829.9pF; Max Power Dissipation: 780mW; Rds On Max: 25mR; Number of Channels: 1; Polarity: N-CHANNEL; Supplier: Rs; Supplier Part Number: 7514086P; RoHS: Yes; Category: MOSFETs; Stock: 600; Pricing: 150=0.2, 750=0.189, 1500=0.153 (GBP); Mounting Technology: Surface Mount; Case/Package: SOT-23-3; Pins: 3; Weight: 0.000282oz; Min Operating Temperature: -55°C; Max Operating Temperature: 150°C; Continuous Drain Current (ID): 4.2A; Packaging: Tape and Reel; Package Quantity: 3000; Drain to Source Voltage (Vdss): 20V; Drain to Source Resistance: 25mR; Series: -; Drain-source On Resistance-Max: 25mR; Length: 3mm; Width: 1.4mm; Height: 1.1mm; Reach SVHC Compliant: Yes; Lead Free: Lead Free; RoHS Compliant: Yes; ComponentLink1URL: https://datasheet.ciiva.com/4444/ds31739-89096-4444460.pdf?src-supplier=Mouser; ComponentLink1Description: https://datasheet.ciiva.com/4444/ds31739-89096-4444460.pdf?src-supplier=Mouser; ComponentLink2URL: https://datasheet.ciiva.com/8115/ds31739-8115355.pdf?src-supplier=Avnet; ComponentLink2Description: https://datasheet.ciiva.com/8115/ds31739-8115355.pdf?src-supplier=Avnet; ComponentLink3URL: https://datasheet.ciiva.com/935/ds31739-935035.pdf?src-supplier=Digi-Key; ComponentLink3Description: https://datasheet.ciiva.com/935/ds31739-935035.pdf?src-supplier=Digi-Key; ComponentLink4URL: https://datasheet.ciiva.com/935/ds31739-935036.pdf?src-supplier=Digi-Key; ComponentLink4Description: https://datasheet.ciiva.com/935/ds31739-935036.pdf?src-supplier=Digi-Key
footprint SOT-23-3
pins: 1 G, 2 S, 3 D

## DMP10H4D2S-7
designator Q?  (value not drawn)
MOSFET P-CH 100V 0.27A SOT23; Manufacturer: Diodes; Manufacturer Part Number: DMP10H4D2S-7; Supplier: Future Electronics; Supplier Part Number: 9078687; RoHS: Yes; Category: MOSFETs; Stock: 66000; Pricing: 3000=0.0544, 9000=0.0524, 15000=0.0515, 45000=0.0495, 75000=0.0479 (USD); ComponentLink1URL: http://www.mouser.com/ds/2/115/DMP10H4D2S-773915.pdf?src-supplier=Mouser; ComponentLink1Description: http://www.mouser.com/ds/2/115/DMP10H4D2S-773915.pdf?src-supplier=Mouser; ComponentLink2URL: http://www.farnell.com/datasheets/2814419.pdf?src-supplier=Farnell; ComponentLink2Description: http://www.farnell.com/datasheets/2814419.pdf?src-supplier=Farnell; ComponentLink3URL: http://www.farnell.com/datasheets/2814419.pdf?src-supplier=Element14; ComponentLink3Description: http://www.farnell.com/datasheets/2814419.pdf?src-supplier=Element14; ComponentLink4URL: http://www.farnell.com/datasheets/2814419.pdf?src-supplier=Newark; ComponentLink4Description: http://www.farnell.com/datasheets/2814419.pdf?src-supplier=Newark; ComponentLink5URL: https://datasheet.octopart.com/DMP10H4D2S-7-Diodes-Inc.-datasheet-104265963.pdf?src-supplier=Future+Electronics; ComponentLink5Description: https://datasheet.octopart.com/DMP10H4D2S-7-Diodes-Inc.-datasheet-104265963.pdf?src-supplier=Future+Electronics; ComponentLink6URL: https://www.diodes.com/assets/Datasheets/DMP10H4D2S.pdf?src-supplier=Digikey; ComponentLink6Description: https://www.diodes.com/assets/Datasheets/DMP10H4D2S.pdf?src-supplier=Digikey
footprint SOT-23-3
pins: 1 G, 2 S, 3 D

## DMPH6250S-13
designator Q?  (value not drawn)
MOSFET P-Channel Enhancement Mode 60V 3-Pin SOT-23 T/R; Manufacturer: Diodes; Manufacturer Part Number: DMPH6250S-13; Supplier: Digikey; Supplier Part Number: 31-DMPH6250S-13CT-ND; RoHS: Yes; Stock: 8662; Pricing: 1=0.42, 10=0.325, 100=0.1947, 500=0.18028, 1000=0.12259, 2000=0.11286, 5000=0.10817 (USD)
footprint SOT-23-3
pins: 1 G, 2 S, 3 D

## DRTR5V0U1LP-7B
designator D?  (value not drawn)
DRTR5V0U1LP Series 250 mW 5.5 V Single ESD Protection TVS Diode - X1-DFN1006-2; Manufacturer: Diodes; Manufacturer Part Number: DRTR5V0U1LP-7B; Value: 1.5pF; Number of Unidirectional Channels: 1; Reverse Standoff Voltage: 5.5V; Min Breakdown Voltage: 6V; Clamping Voltage: 10V; Power Line Protection: No; Polarity: Unidirectional; Peak Pulse Current: 5A; Diode Type: ZENER; Supplier: Digi-Key; Supplier Part Number: DRTR5V0U1LP-7BDICT-ND; RoHS: Yes; Category: TVS Diodes; Stock: 15568; Pricing: 1=0.44000, 10=0.33000, 100=0.18660, 500=0.12360, 1000=0.09476, 2000=0.08240, 5000=0.07416 (USD); Mounting Technology: Surface Mount; Case/Package: 0402; Pins: 2; Case Code (Imperial): 0402; Case Code (Metric): 1006; Min Operating Temperature: -65°C; Max Operating Temperature: 150°C; Package Quantity: 10000; Packaging: Tape and Reel; Termination: SMD/SMT; Working Voltage: 5.5V; Breakdown Voltage: 6V; Element Configuration: Single; Resistor Type: Zener; Series: Automotive, AEC-Q101; Length: 1mm; Width: 0.6mm; Height: 0.5mm; Radiation Hardening: No; Reach SVHC Compliant: Yes; RoHS Compliant: Yes; ComponentLink1URL: https://datasheet.ciiva.com/15063/drtr5v0u1lp-15063572.pdf?src-supplier=Digi-Key; ComponentLink1Description: https://datasheet.ciiva.com/15063/drtr5v0u1lp-15063572.pdf?src-supplier=Digi-Key; ComponentLink2URL: https://datasheet.ciiva.com/24013/drtr5v0u1lp-247240-24013178.pdf?src-supplier=Mouser; ComponentLink2Description: https://datasheet.ciiva.com/24013/drtr5v0u1lp-247240-24013178.pdf?src-supplier=Mouser; ComponentLink3URL: https://datasheet.ciiva.com/29883/drtr5v0u1lp-29883803.pdf?src-supplier=Avnet; ComponentLink3Description: https://datasheet.ciiva.com/29883/drtr5v0u1lp-29883803.pdf?src-supplier=Avnet; ComponentLink4URL: https://datasheet.ciiva.com/15063/drtr5v0u1lp-15063573.pdf?src-supplier=Digi-Key; ComponentLink4Description: https://datasheet.ciiva.com/15063/drtr5v0u1lp-15063573.pdf?src-supplier=Digi-Key; ComponentLink5URL: https://datasheet.ciiva.com/15063/drtr5v0u1lp-15063574.pdf?src-supplier=Digi-Key; ComponentLink5Description: https://datasheet.ciiva.com/15063/drtr5v0u1lp-15063574.pdf?src-supplier=Digi-Key
footprint DRTR5V0U1LP-7B
pins: 1, 2
